# Altium footprint library HW_HOLLAND_NCDM_MONITOR_R1.PcbLib: 472 footprints (part 29 of 30)
Each footprint in its own frame and in the unit in brackets; x right, y up, seen from the top. Pads: shape width x height; smd on the part's side, far side on the other; paste and mask are expansions set on the pad; w line width, h text height; cw(c..) or ccw(c..) is an arc to the next point about the centre after c.
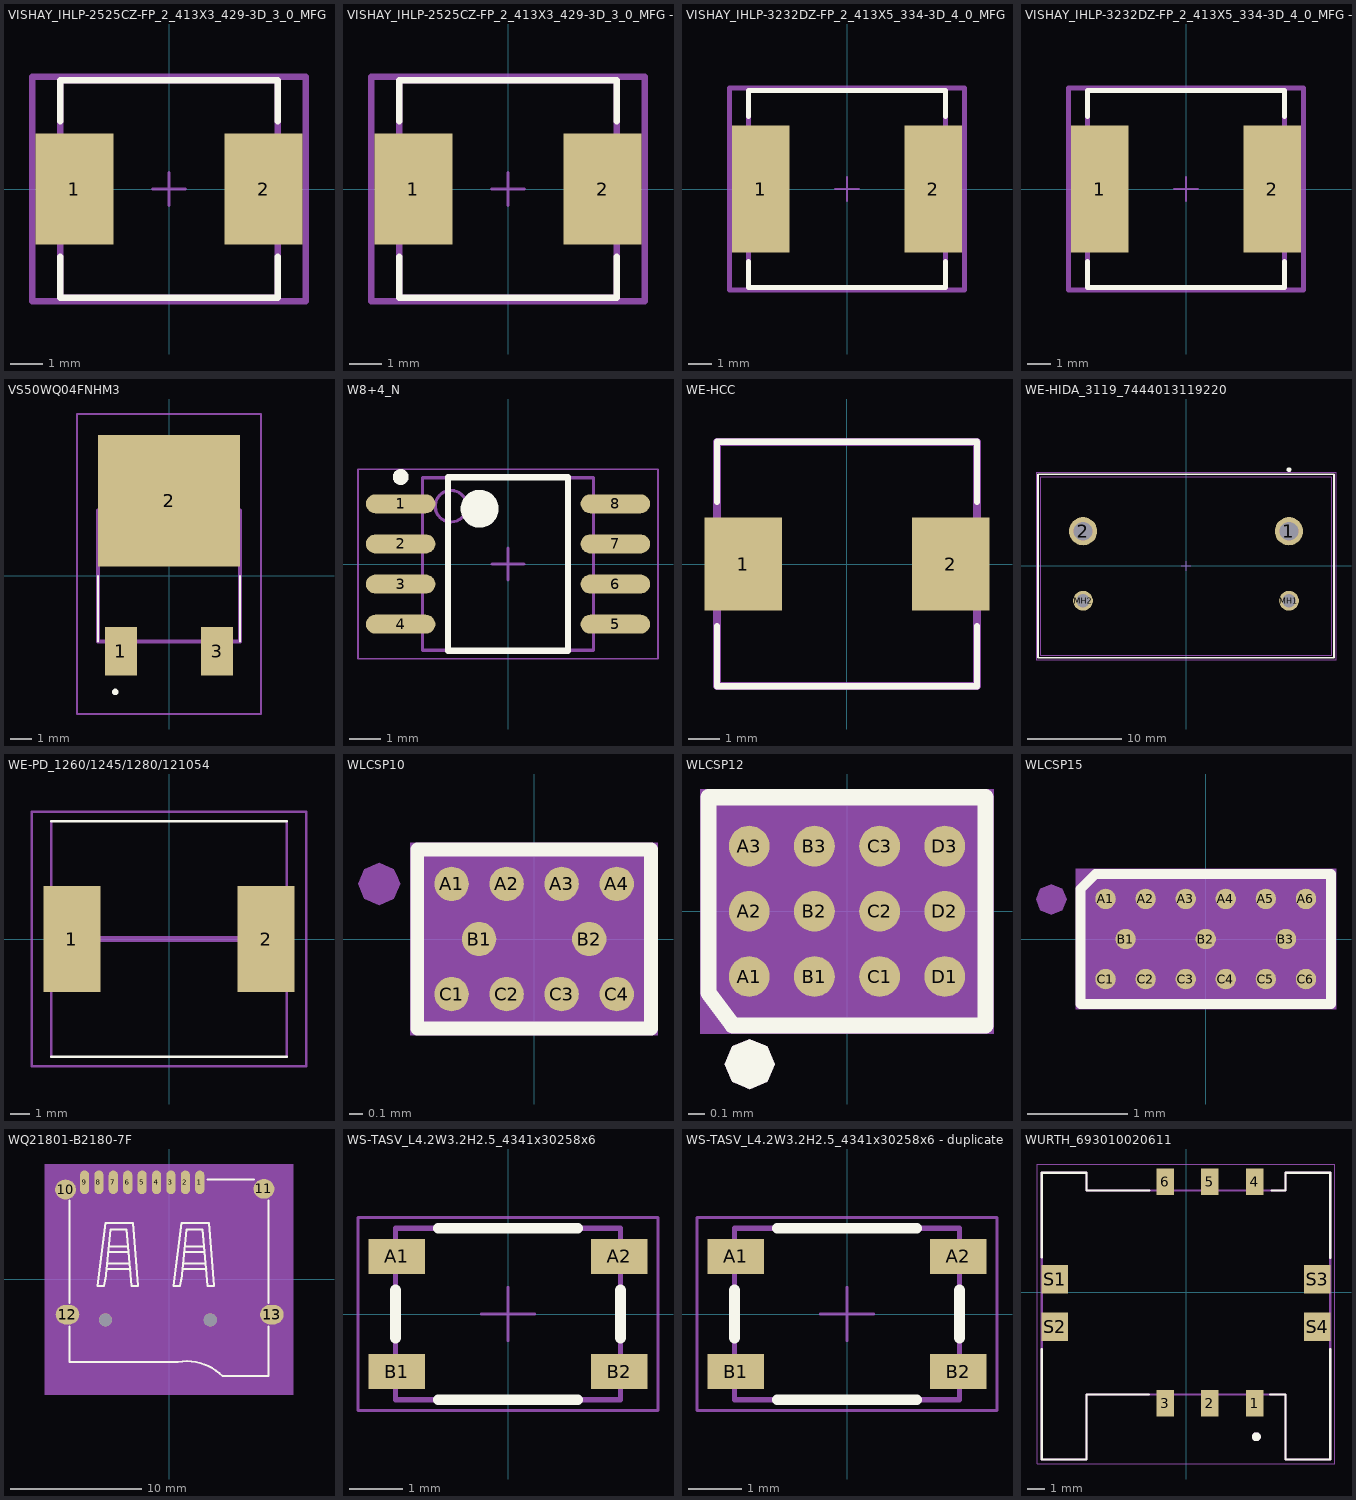
[diagram p28: the footprints below, top view; thin cyan lines are the x and y axes]

## VISHAY_IHLP-2525CZ-FP_2_413X3_429-3D_3_0_MFG [mil]
pads (2):
  rect 95x135 smd paste+0 mask+0: 1(-115,0) 2(115,0)
Top Overlay:
  lines w7.87: -132.36,-82.26 -132.36,-132.36 132.36,-132.36 132.36,-82.26 ; -132.36,82.26 -132.36,132.36 132.36,132.36 132.36,82.26
Top Courtyard:
  lines w7.87: -166.44,-136.3 -166.44,136.3 166.44,136.3 166.44,-136.3 -166.44,-136.3
  text ".Designator" at 0,7.4 h39.37
Mechanical 12:
  lines w7.87: -132.36,-132.36 -132.36,132.36 132.36,132.36 132.36,-132.36 -132.36,-132.36
Mechanical 15:
  lines w3.94: -19.68,0 19.68,0 ; 0,-19.68 0,19.68
  lines w7.87: -166.44,-136.3 -166.44,136.3 166.44,136.3 166.44,-136.3 -166.44,-136.3
3D body "Ind_Vishay_IHLP2525CZER8R2M01_eec.STEP": height 118.15, standoff 0, extent -135.04,-127.36 135.04,127.37

## VISHAY_IHLP-2525CZ-FP_2_413X3_429-3D_3_0_MFG - duplicate [mil]
pads (2):
  rect 95x135 smd paste+0 mask+0: 1(-115,0) 2(115,0)
Top Overlay:
  lines w7.87: -132.36,-82.26 -132.36,-132.36 132.36,-132.36 132.36,-82.26 ; -132.36,82.26 -132.36,132.36 132.36,132.36 132.36,82.26
Top Courtyard:
  lines w7.87: -166.44,-136.3 166.44,-136.3 166.44,136.3 -166.44,136.3 -166.44,-136.3
  text ".Designator" at 0,7.4 h39.37
Mechanical 12:
  lines w7.87: -132.36,-132.36 132.36,-132.36 132.36,132.36 -132.36,132.36 -132.36,-132.36
Mechanical 15:
  lines w3.94: -19.68,0 19.68,0 ; 0,-19.68 0,19.68
  lines w7.87: -166.44,-136.3 166.44,-136.3 166.44,136.3 -166.44,136.3 -166.44,-136.3
3D body "Ind_Vishay_IHLP2525CZER8R2M01_eec.STEP": height 118.15, standoff 0, extent -135.04,-127.36 135.04,127.37

## VISHAY_IHLP-3232DZ-FP_2_413X5_334-3D_4_0_MFG [mil]
pads (2):
  rect 95x210 smd paste+0 mask+0: 1(-142.5,0) 2(142.5,0)
Top Overlay:
  lines w7.87: -162.52,-119.76 -162.52,-162.52 162.52,-162.52 162.52,-119.76 ; -162.52,119.76 -162.52,162.52 162.52,162.52 162.52,119.76
Top Courtyard:
  lines w7.87: -193.94,-166.46 -193.94,166.46 193.94,166.46 193.94,-166.46 -193.94,-166.46
  text ".Designator" at 0,7.4 h39.37
Mechanical 12:
  lines w7.87: -162.52,-162.52 -162.52,162.52 162.52,162.52 162.52,-162.52 -162.52,-162.52
Mechanical 15:
  lines w3.94: -19.68,0 19.68,0 ; 0,-19.68 0,19.68
  lines w7.87: -193.94,-166.46 -193.94,166.46 193.94,166.46 193.94,-166.46 -193.94,-166.46
3D body "Ind_Vishay_IHLP3232DZER150M11_eec.STEP": height 157.52, standoff 0, extent -170.08,-161.02 170.08,161.03

## VISHAY_IHLP-3232DZ-FP_2_413X5_334-3D_4_0_MFG - duplicate [mil]
pads (2):
  rect 95x210 smd paste+0 mask+0: 1(-142.5,0) 2(142.5,0)
Top Overlay:
  lines w7.87: -162.52,-119.76 -162.52,-162.52 162.52,-162.52 162.52,-119.76 ; -162.52,119.76 -162.52,162.52 162.52,162.52 162.52,119.76
Top Courtyard:
  lines w7.87: -193.94,-166.46 -193.94,166.46 193.94,166.46 193.94,-166.46 -193.94,-166.46
  text ".Designator" at 0,7.4 h39.37
Mechanical 12:
  lines w7.87: -162.52,-162.52 -162.52,162.52 162.52,162.52 162.52,-162.52 -162.52,-162.52
Mechanical 15:
  lines w3.94: -19.68,0 19.68,0 ; 0,-19.68 0,19.68
  lines w7.87: -193.94,-166.46 -193.94,166.46 193.94,166.46 193.94,-166.46 -193.94,-166.46
3D body "Ind_Vishay_IHLP3232DZER150M11_eec.STEP": height 157.52, standoff 0, extent -170.08,-161.02 170.08,161.03

## VS50WQ04FNHM3 [mm]
pads (3):
  rect 1.524x2.28 smd: 1(-2.28,-3.572) 3(2.28,-3.572)
  rect 6.74x6.23 smd: 2(0,3.572)
Top Overlay:
  lines w0.1: -3.365,-3.11 -3.365,0 ; 3.365,-3.11 3.365,0
  lines w0.2: -2.6,-5.5 cw(c-2.55,-5.5) -2.5,-5.5 cw(c-2.55,-5.5) -2.6,-5.5
Mechanical 13:
  lines w0.2: -3.365,-3.11 3.365,-3.11 3.365,3.11 -3.365,3.11 -3.365,-3.11
Mechanical 15:
  lines w0.1: -4.37,-6.55 4.37,-6.55 4.37,7.688 -4.37,7.688 -4.37,-6.55
3D body "VS-50WQ04FNHM3.stp": height 2.39, standoff -0.01, extent -3.367,-4.123 3.367,5.977

## W8+4_N [mm]
pads (8):
  oval 2.2x0.6 smd: 1(-3.4,1.905) 2(-3.4,0.635) 3(-3.4,-0.635) 4(-3.4,-1.905) 5(3.4,-1.905) 6(3.4,-0.635) 7(3.4,0.635) 8(3.4,1.905)
Top Overlay:
  circle w0.25: c-3.4,2.755 r0.125
  circle w0.6: c-0.9,1.75 r0.3
  lines w0.2: -1.9,-2.75 -1.9,2.75 1.9,2.75 1.9,-2.75 -1.9,-2.75
Mechanical 13:
  circle w0.1: c-1.805,1.83 r0.5
  lines w0.1: -2.705,-2.73 -2.705,2.73 2.705,2.73 2.705,-2.73 -2.705,-2.73
Mechanical 15:
  lines w0.05: -4.75,-3 -4.75,3 4.75,3 4.75,-3 -4.75,-3
  lines w0.1: -0.5,0 0.5,0 ; 0,-0.5 0,0.5
3D body: height 2.13, standoff 0.05, extent -2.705,-2.73 2.705,2.73

## WE-HCC [mm]
height 0.52
pads (2):
  rect 2.5x3 smd: 1(-3.35,0) 2(3.35,0)
Top Overlay:
  lines w0.2: -4.2,-2 -4.2,-3.95 4.2,-3.95 4.2,-2 ; -4.2,2 -4.2,3.95 4.2,3.95 4.2,2
Top Designator:
  lines w0.254: -4.2,-3.95 -4.2,3.95 4.2,3.95 4.2,-3.95 -4.2,-3.95
  text ".Designator" at -12.696,-0.846 h2.54
3D body "7443340030_Download_STP_WE-HCC-8070_rev1.stp": height 7.15, standoff -0.05, extent -4.2,-3.95 4.2,3.95

## WE-HIDA_3119_7444013119220 [mm]
pads (4):
  round 3 hole 2: 1(10.95,3.7) 2(-10.95,3.7)
  round 2.1 hole 1.4: MH1(10.95,-3.7) MH2(-10.95,-3.7)
Top Overlay:
  circle w0.25: c10.95,10.25 r0.125
  lines w0.2: -15.75,-9.75 15.75,-9.75 15.75,9.75 -15.75,9.75 -15.75,-9.75
Top 3D Body:
  lines w0.1: -15.5,-9.5 -15.5,9.5 15.5,9.5 15.5,-9.5 -15.5,-9.5
Top Component Outline:
  lines w0.1: -15.5,-9.5 15.5,-9.5 15.5,9.5 -15.5,9.5 -15.5,-9.5
Top Courtyard:
  lines w0.05: -0.5,0 0.5,0 ; 0,-0.5 0,0.5 ; -15.95,-9.95 15.95,-9.95 15.95,9.95 -15.95,9.95 -15.95,-9.95
Top Designator:
  text ".Designator" at -2.812,0.282 h1.25
3D body "7444xx3119xxx.stp": height 31.55, standoff -4.95, extent -15.5,-9.5 15.5,9.5

## WE-PD_1260/1245/1280/121054 [mm]
pads (2):
  rect 2.9x5.4 smd: 1(-4.95,0) 2(4.95,0)
Top Overlay:
  lines w0.127: -6,-6 6,-6 ; -6,6 6,6
Mechanical 13:
  lines w0.127: -6,-6 -6,6 ; 6,-6 6,6
  lines w0.305: -4.95,0 4.95,0
Mechanical 15:
  lines w0.127: -7,-6.5 7,-6.5 7,6.5 -7,6.5 -7,-6.5
3D body "744771218.stp": height 8, standoff 0, extent -6,-6 6,6

## WLCSP10 [mm]
pads (10):
  round 0.25 smd: A1(-0.6,0.4) A2(-0.2,0.4) A3(0.2,0.4) A4(0.6,0.4) B1(-0.4,0) B2(0.4,0) C1(-0.6,-0.4) C2(-0.2,-0.4) C3(0.2,-0.4) C4(0.6,-0.4)
Top Overlay:
  lines w0.1: 0.85,0.6 0.85,0.65 ; 0.85,0.65 -0.85,0.65 -0.85,-0.65 0.85,-0.65 0.85,0.65
  text ".Designator" at -0.635,-0.212 h0.64
Top Assembly:
  dashed: -1.127,0.247 -1.018,0.292 -0.974,0.4 -1.003,0.471 -1.018,0.508 -1.127,0.553 -1.235,0.508 -1.25,0.471 -1.28,0.4 -1.235,0.292
  lines w0.025: -0.8,-0.6 -0.8,0.6 0.8,0.6 0.8,-0.6 -0.8,-0.6
Top 3D Body:
  region: -0.9,0.7 0.9,0.7 0.9,-0.7 -0.9,-0.7
Mechanical 17:
  text "B2" at 0.4,1.626 h2.03
  text "B1" at -0.4,1.626 h2.03
  text "C4" at 0.6,1.226 h2.03
  text "C1" at -0.6,1.226 h2.03
  text "C2" at -0.2,1.226 h2.03
  text "C3" at 0.2,1.226 h2.03
  text "A3" at 0.2,2.026 h2.03
  text "A4" at 0.6,2.026 h2.03
  text "A1" at -0.6,2.026 h2.03
  text "A2" at -0.2,2.026 h2.03
3D body: height 3.81, standoff 0, extent -0.9,-0.7 0.9,0.7

## WLCSP12 [mm]
pads (12):
  round 0.25 smd: A1(-0.6,-0.4) A2(-0.6,0) A3(-0.6,0.4) B1(-0.2,-0.4) B2(-0.2,0) B3(-0.2,0.4) C1(0.2,-0.4) C2(0.2,0) C3(0.2,0.4) D1(0.6,-0.4) D2(0.6,0) D3(0.6,0.4)
Top Overlay:
  dashed: -0.443,-0.937 -0.488,-0.828 -0.596,-0.783 -0.668,-0.813 -0.705,-0.828 -0.75,-0.937 -0.705,-1.045 -0.668,-1.06 -0.596,-1.09 -0.488,-1.045
  lines w0.1: -0.85,-0.5 -0.85,0.7 0.85,0.7 0.85,-0.7 -0.7,-0.7 -0.85,-0.5
  text ".Designator" at -0.953,-0.212 h0.64
Top Assembly:
  dashed: -0.443,-0.937 -0.488,-0.828 -0.596,-0.783 -0.668,-0.813 -0.705,-0.828 -0.75,-0.937 -0.705,-1.045 -0.668,-1.06 -0.596,-1.09 -0.488,-1.045
  lines w0.025: -0.85,-0.7 -0.85,0.7 0.85,0.7 0.85,-0.7 -0.85,-0.7
Top 3D Body:
  region: -0.9,0.75 0.9,0.75 0.9,-0.75 -0.9,-0.75
Mechanical 17:
  text "B2" at -1.825,0 h2.03
  text "C1" at -1.426,-0.4 h2.03
  text "B1" at -1.825,-0.4 h2.03
  text "D3" at -1.026,0.4 h2.03
  text "C3" at -1.426,0.4 h2.03
  text "B3" at -1.825,0.4 h2.03
  text "D1" at -1.026,-0.4 h2.03
  text "C2" at -1.426,0 h2.03
  text "D2" at -1.026,0 h2.03
  text "A3" at -2.226,0.4 h2.03
  text "A1" at -2.226,-0.4 h2.03
  text "A2" at -2.226,0 h2.03
3D body: height 3.81, standoff 0, extent -0.9,-0.75 0.9,0.75

## WLCSP15 [mil]
pads (15):
  round 8 smd: A1(-39.37,15.75) A2(-23.62,15.75) A3(-7.87,15.75) A4(7.87,15.75) A5(23.62,15.75) A6(39.37,15.75) B1(-31.5,0) B2(0,0) B3(31.5,0) C1(-39.37,-15.75) C2(-23.62,-15.75) C3(-7.87,-15.75) C4(7.87,-15.75) C5(23.62,-15.75) C6(39.37,-15.75)
Top Overlay:
  lines w3.94: -49.21,-25.59 -49.21,19.69 -43.31,25.59 49.21,25.59 49.21,-25.59 -49.21,-25.59
  text ".Designator" at -37.51,-8.33 h25
Top Assembly:
  dashed: -60.69,9.53 -56.43,11.3 -54.66,15.56 -55.82,18.36 -56.43,19.82 -60.69,21.58 -64.95,19.82 -65.55,18.36 -66.71,15.56 -64.95,11.3
  lines w1: -47.24,-23.62 -47.24,23.62 47.24,23.62 47.24,-23.62 -47.24,-23.62
Top 3D Body:
  region: -51.18,27.56 51.18,27.56 51.18,-27.56 -51.18,-27.56
Mechanical 17:
  text "B3" at 32.37,18.1 h25
  text "B2" at 0.92,18.28 h25
  text "B1" at -30.34,17.91 h25
  text "C4" at 7.51,0.92 h25
  text "C3" at -8.24,0.92 h25
  text "C6" at 40.48,0.2 h25
  text "C5" at 23.26,0.92 h25
  text "C1" at -39.74,0.92 h25
  text "C2" at -23.99,0.92 h25
  text "A3" at -7.41,33.26 h25
  text "A4" at 7.58,33.45 h25
  text "A2" at -23.87,33.82 h25
  text "A1" at -38.3,32.9 h25
  text "A5" at 23.87,33.09 h25
  text "A6" at 39.97,32.9 h25
3D body: height 150, standoff 0, extent -51.18,-27.56 51.18,27.56

## WQ21801-B2180-7F [mm]
pads (15):
  oval 0.7x1.8 smd: 1(2.35,7.4) 2(1.25,7.4) 3(0.15,7.4) 4(-0.95,7.4) 5(-2.05,7.4) 6(-3.15,7.4) 7(-4.25,7.4) 8(-5.35,7.4) 9(-6.45,7.4)
  oval 1.6x1.5 smd: 10(-7.9,6.85) 11(7.25,6.9)
  oval 1.8x1.5 smd: 12(-7.75,-2.7) 13(7.85,-2.7)
  round 1 hole 1 unplated: ""(-4.85,-3.1) ""(3.15,-3.1)
Top Overlay:
  lines w0.152: -7.6,-3.6 -7.6,-6.3 0.7,-6.3 cw(c1.324,-10.176) 4.1,-7.4 7.6,-7.4 7.6,-3.6 ; -7.6,-1.8 -7.6,6 ; -4.85,0 -4.45,3.8 -3.25,3.8 -2.85,-0.5 -2.35,-0.5 -2.75,4.3 -4.85,4.3 -5.45,-0.5 -4.95,-0.5 -4.85,0.1 ; -4.75,0.8 -2.95,0.8 ; -4.65,1.2 -3.05,1.2 ; -4.65,2.1 -3.15,2.1 ; -4.55,2.5 -3.15,2.5 ; 0.95,0 1.35,3.8 2.55,3.8 2.95,-0.5 3.45,-0.5 3.05,4.3 0.95,4.3 0.35,-0.5 0.85,-0.5 0.95,0.1 ; 1.05,0.8 2.85,0.8 ; 1.15,1.2 2.75,1.2 ; 1.15,2.1 2.65,2.1 ; 1.25,2.5 2.65,2.5 ; 2.95,7.6 6.5,7.6 ; 7.6,-1.8 7.6,6
  text ".Designator" at -0.635,-0.212 h0.64
Top Assembly:
  lines w0.025: -7.6,-7.4 -7.6,7.6 7.6,7.6 7.6,-7.4 -7.6,-7.4
Top 3D Body:
  region: -9.5,8.8 -9.5,-8.8 9.5,-8.8 9.5,8.8
Mechanical 17:
  text "5" at -2.05,6.181 h1.52
  text "2" at 1.25,6.181 h1.52
  text "7" at -4.25,6.181 h1.52
  text "1" at 2.35,6.181 h1.52
  text "9" at -6.45,6.181 h1.52
  text "8" at -5.35,6.181 h1.52
  text "3" at 0.15,6.181 h1.52
  text "4" at -0.95,6.181 h1.52
  text "13" at 7.85,-3.066 h0.46
  text "12" at -7.75,-3.066 h0.46
  text "10" at -7.9,5.631 h1.52
  text "6" at -3.15,6.181 h1.52
  text "11" at 7.25,5.681 h1.52
3D body: height 3.81, standoff 0, extent -9.5,-8.8 9.5,8.8

## WS-TASV_L4.2W3.2H2.5_4341x30258x6 [mm]
pads (4):
  rect 1.05x0.65 smd: A1(-2.075,1.075) A2(2.075,1.075) B1(-2.075,-1.075) B2(2.075,-1.075)
Top Overlay:
  lines w0.2: -2.1,-0.45 -2.1,0.45 ; -1.3,-1.6 1.3,-1.6 ; -1.3,1.6 1.3,1.6 ; 2.1,-0.45 2.1,0.45
Top 3D Body:
  lines w0.1: -2.1,-1.6 2.1,-1.6 2.1,1.6 -2.1,1.6 -2.1,-1.6
Top Component Outline:
  lines w0.1: -2.1,-1.6 -2.1,1.6 2.1,1.6 2.1,-1.6 -2.1,-1.6
Top Courtyard:
  lines w0.05: -0.5,0 0.5,0 ; 0,-0.5 0,0.5 ; -2.8,-1.8 -2.8,1.8 2.8,1.8 2.8,-1.8 -2.8,-1.8
Top Designator:
  text ".Designator" at -4.998,-0.333 h1
3D body "4341x30258x6.stp": height 2.5, standoff 0, extent -2.299,-1.6 2.299,1.6

## WS-TASV_L4.2W3.2H2.5_4341x30258x6 - duplicate [mm]
pads (4):
  rect 1.05x0.65 smd: A1(-2.075,1.075) A2(2.075,1.075) B1(-2.075,-1.075) B2(2.075,-1.075)
Top Overlay:
  lines w0.2: -2.1,-0.45 -2.1,0.45 ; -1.3,-1.6 1.3,-1.6 ; -1.3,1.6 1.3,1.6 ; 2.1,-0.45 2.1,0.45
Top 3D Body:
  lines w0.1: -2.1,-1.6 -2.1,1.6 2.1,1.6 2.1,-1.6 -2.1,-1.6
Top Component Outline:
  lines w0.1: -2.1,-1.6 2.1,-1.6 2.1,1.6 -2.1,1.6 -2.1,-1.6
Top Courtyard:
  lines w0.05: -0.5,0 0.5,0 ; 0,-0.5 0,0.5 ; -2.8,-1.8 2.8,-1.8 2.8,1.8 -2.8,1.8 -2.8,-1.8
Top Designator:
  text ".Designator" at -4.998,-0.333 h1
3D body "4341x30258x6.stp": height 2.5, standoff 0, extent -2.299,-1.6 2.299,1.6

## WURTH_693010020611 [mm]
pads (10):
  rect 1x1.5 smd: 1(3.9,-6.3) 2(1.36,-6.3) 3(-1.18,-6.3) 4(3.9,6.3) 5(1.36,6.3) 6(-1.18,6.3)
  rect 1.5x1.6 smd: S1(-7.45,0.75) S2(-7.45,-1.95) S3(7.45,0.75) S4(7.45,-1.95)
Top Overlay:
  circle w0.3: c4,-8.2 r0.1
  lines w0.127: -8.2,-3.21 -8.2,-9.5 -5.65,-9.5 -5.65,-5.8 ; -8.2,2 -8.2,6.8 -5.65,6.8 -5.65,5.8 -2.08,5.8 ; -5.63,-5.8 -2.1,-5.8 ; 4.79,-5.8 5.65,-5.8 5.65,-9.5 8.2,-9.5 8.2,-3.23 ; 4.87,5.8 5.65,5.8 5.65,6.8 8.2,6.8 8.2,1.96
Mechanical 13:
  circle w0.3: c4,-8.2 r0.1
  lines w0.127: -8.2,-9.5 -5.65,-9.5 -5.65,-5.8 5.65,-5.8 5.65,-9.5 8.2,-9.5 8.2,6.8 5.65,6.8 5.65,5.8 -5.65,5.8 -5.65,6.8 -8.2,6.8 -8.2,-9.5
Mechanical 15:
  lines w0.05: -8.45,-9.75 -8.45,7.3 8.45,7.3 8.45,-9.75 -8.45,-9.75
3D body "693010020611 (rev1).stp": height 1.86, standoff 0.01, extent -8.2,-9.55 8.2,6.75